# Altium footprint library LukaLIBRARY.PcbLib: 772 footprints (part 6 of 49)
Each footprint in its own frame and in the unit in brackets; x right, y up, seen from the top. Pads: shape width x height; smd on the part's side, far side on the other; paste and mask are expansions set on the pad; w line width, h text height; cw(c..) or ccw(c..) is an arc to the next point about the centre after c.
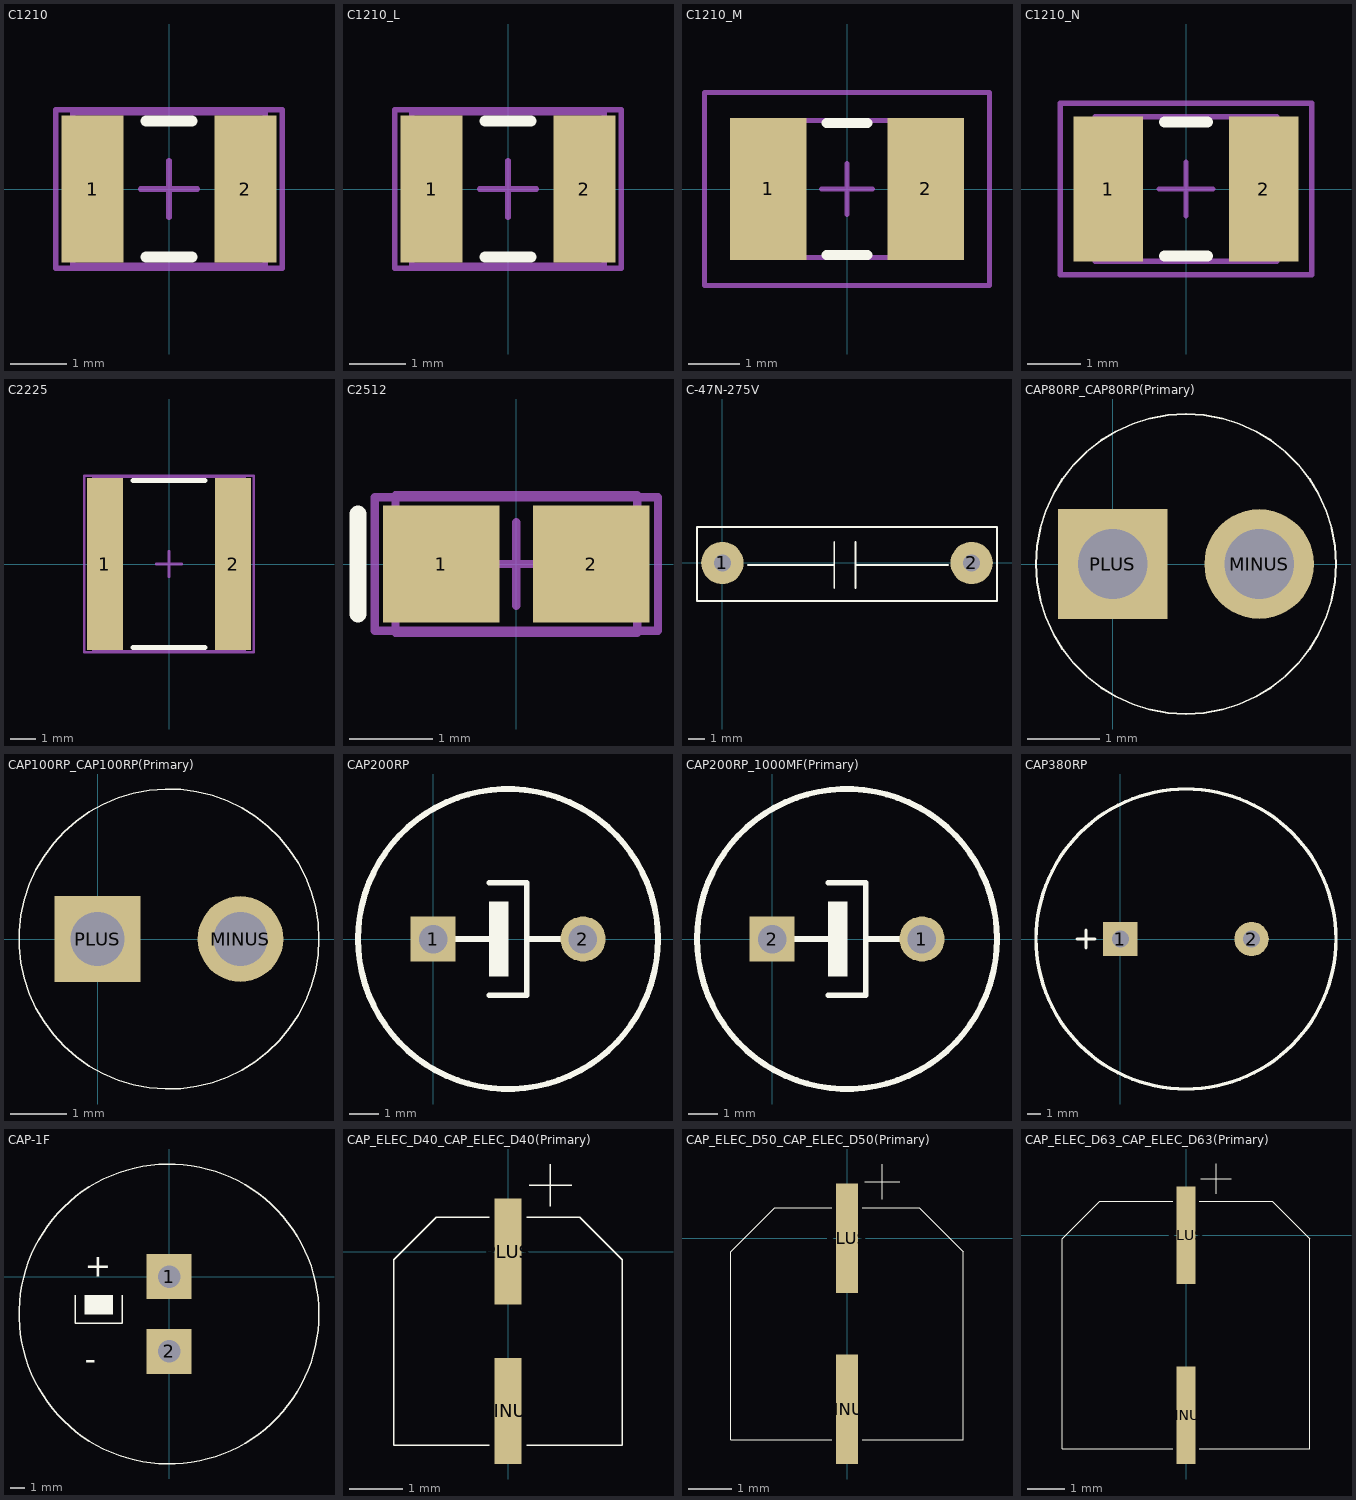
[diagram p5: the footprints below, top view; thin cyan lines are the x and y axes]

## C1210 [mm] "Chip Capacitor, Body 3.2x2.5mm, IPC High Density"
height 1.3
pads (2):
  rect 1.1x2.6 smd: 1(-1.35,0) 2(1.35,0)
Top Overlay:
  lines w0.2: -0.4,-1.2 0.4,-1.2 ; -0.4,1.2 0.4,1.2
Mechanical 13:
  lines w0.1: -1.7,-1.35 1.7,-1.35 1.7,1.35 -1.7,1.35 -1.7,-1.35
Mechanical 15:
  lines w0.1: -0.5,0 0.5,0 ; 0,-0.5 0,0.5 ; -2,-1.4 2,-1.4 2,1.4 -2,1.4 -2,-1.4
3D body: height 1.3, standoff 0, extent -1.7,-1.35 1.7,1.35

## C1210_L [mm] "Chip Capacitor, Body 3.2x2.5mm, IPC High Density"
height 1.5
pads (2):
  rect 1.1x2.6 smd: 1(-1.35,0) 2(1.35,0)
Top Overlay:
  lines w0.2: -0.4,-1.2 0.4,-1.2 ; -0.4,1.2 0.4,1.2
Mechanical 13:
  lines w0.1: -1.7,-1.35 1.7,-1.35 1.7,1.35 -1.7,1.35 -1.7,-1.35
Mechanical 15:
  lines w0.1: -0.5,0 0.5,0 ; 0,-0.5 0,0.5 ; -2,-1.4 2,-1.4 2,1.4 -2,1.4 -2,-1.4
3D body: height 1.5, standoff 0, extent -1.7,-1.35 1.7,1.35

## C1210_M [mm] "Chip Capacitor, Body 3.2x2.5mm, IPC Low Density"
height 1.5
pads (2):
  rect 1.5x2.8 smd: 1(-1.55,0) 2(1.55,0)
Top Overlay:
  lines w0.2: -0.4,-1.3 0.4,-1.3 ; -0.4,1.3 0.4,1.3
Mechanical 13:
  lines w0.1: -1.7,-1.35 1.7,-1.35 1.7,1.35 -1.7,1.35 -1.7,-1.35
Mechanical 15:
  lines w0.1: -0.5,0 0.5,0 ; 0,-0.5 0,0.5 ; -2.8,-1.9 2.8,-1.9 2.8,1.9 -2.8,1.9 -2.8,-1.9
3D body: height 1.5, standoff 0, extent -1.7,-1.35 1.7,1.35

## C1210_N [mm] "Chip Capacitor, Body 3.2x2.5mm, IPC Medium Density"
height 1.5
pads (2):
  rect 1.3x2.7 smd: 1(-1.45,0) 2(1.45,0)
Top Overlay:
  lines w0.2: -0.4,-1.25 0.4,-1.25 ; -0.4,1.25 0.4,1.25
Mechanical 13:
  lines w0.1: -1.7,-1.35 1.7,-1.35 1.7,1.35 -1.7,1.35 -1.7,-1.35
Mechanical 15:
  lines w0.1: -0.5,0 0.5,0 ; 0,-0.5 0,0.5 ; -2.35,-1.6 2.35,-1.6 2.35,1.6 -2.35,1.6 -2.35,-1.6
3D body: height 1.5, standoff 0, extent -1.7,-1.35 1.7,1.35

## C2225 [mm] "Chip Capacitor, Body 5.7x6.4mm, IPC High Density"
height 1.4
pads (2):
  rect 1.4x6.7 smd: 1(-2.5,0) 2(2.5,0)
Top Overlay:
  lines w0.2: -1.4,-3.25 1.4,-3.25 ; -1.4,3.25 1.4,3.25
Mechanical 13:
  lines w0.1: -2.95,-3.4 -2.95,3.4 2.95,3.4 2.95,-3.4 -2.95,-3.4
Mechanical 15:
  lines w0.1: -0.5,0 0.5,0 ; 0,-0.5 0,0.5 ; -3.3,-3.45 -3.3,3.45 3.3,3.45 3.3,-3.45 -3.3,-3.45
3D body: height 1.4, standoff 0, extent -2.95,-3.4 2.95,3.4

## C2512 [mm] "Chip Capacitor, Body 2.54x1.27mm, IPC High Density"
height 1.3
pads (2):
  rect 1.4x1.4 smd: 1(-0.9,0) 2(0.9,0)
Top Overlay:
  lines w0.2: -1.9,-0.6 -1.9,0.6
Mechanical 13:
  lines w0.1: -1.45,-0.825 1.45,-0.825 1.45,0.825 -1.45,0.825 -1.45,-0.825
Mechanical 15:
  lines w0.1: -0.5,0 0.5,0 ; 0,-0.5 0,0.5 ; -1.7,-0.8 1.7,-0.8 1.7,0.8 -1.7,0.8 -1.7,-0.8
3D body: height 1.3, standoff 0, extent -1.45,-0.825 1.45,0.825

## C-47N-275V [mil]
pads (2):
  round 100 hole 40 mask-1000: 1(0,0) 2(590,0)
Top Overlay:
  lines w3.94: 60,-5 265,-5 ; 265,-60 265,50 ; 315,-60 315,50 ; 315,-5 535,-5 ; -60,-90 650,-90 650,85 -60,85 -60,-90
Top Solder:
  region: 590,50.43 576.95,48.71 564.78,43.67 554.34,35.66 546.33,25.22 541.29,13.05 539.57,0 541.29,-13.05 546.33,-25.22 554.34,-35.66 564.78,-43.67 576.95,-48.71 590,-50.43 603.05,-48.71 615.22,-43.67 625.66,-35.66 633.67,-25.22 638.71,-13.05 640.43,0 638.71,13.05 633.67,25.22 625.66,35.66 615.22,43.67 603.05,48.71
  region: 0,50.43 -13.05,48.71 -25.22,43.67 -35.66,35.66 -43.67,25.22 -48.71,13.05 -50.43,0 -48.71,-13.05 -43.67,-25.22 -35.66,-35.66 -25.22,-43.67 -13.05,-48.71 0,-50.43 13.05,-48.71 25.22,-43.67 35.66,-35.66 43.67,-25.22 48.71,-13.05 50.43,0 48.71,13.05 43.67,25.22 35.66,35.66 25.22,43.67 13.05,48.71
Bottom Solder:
  region: 590,50.43 576.95,48.71 564.78,43.67 554.34,35.66 546.33,25.22 541.29,13.05 539.57,0 541.29,-13.05 546.33,-25.22 554.34,-35.66 564.78,-43.67 576.95,-48.71 590,-50.43 603.05,-48.71 615.22,-43.67 625.66,-35.66 633.67,-25.22 638.71,-13.05 640.43,0 638.71,13.05 633.67,25.22 625.66,35.66 615.22,43.67 603.05,48.71
  region: 0,50.43 -13.05,48.71 -25.22,43.67 -35.66,35.66 -43.67,25.22 -48.71,13.05 -50.43,0 -48.71,-13.05 -43.67,-25.22 -35.66,-35.66 -25.22,-43.67 -13.05,-48.71 0,-50.43 13.05,-48.71 25.22,-43.67 35.66,-35.66 43.67,-25.22 48.71,-13.05 50.43,0 48.71,13.05 43.67,25.22 35.66,35.66 25.22,43.67 13.05,48.71

## CAP80RP_CAP80RP(Primary) [mil]
pads (2):
  round 60 hole 38 mask-1000: MINUS(80,0)
  rect 60x60 hole 38 mask-1000: PLUS(0,0)
Top Overlay:
  circle w1: c40,0 r82
Top Solder:
  region: -30,-30 30,-30 30,30 -30,30
  region: 80,30.26 72.17,29.23 64.87,26.2 58.6,21.4 53.8,15.13 50.77,7.83 49.74,0 50.77,-7.83 53.8,-15.13 58.6,-21.4 64.87,-26.2 72.17,-29.23 80,-30.26 87.83,-29.23 95.13,-26.2 101.4,-21.4 106.2,-15.13 109.23,-7.83 110.26,0 109.23,7.83 106.2,15.13 101.4,21.4 95.13,26.2 87.83,29.23
Bottom Solder:
  region: -30,-30 30,-30 30,30 -30,30
  region: 80,30.26 72.17,29.23 64.87,26.2 58.6,21.4 53.8,15.13 50.77,7.83 49.74,0 50.77,-7.83 53.8,-15.13 58.6,-21.4 64.87,-26.2 72.17,-29.23 80,-30.26 87.83,-29.23 95.13,-26.2 101.4,-21.4 106.2,-15.13 109.23,-7.83 110.26,0 109.23,7.83 106.2,15.13 101.4,21.4 95.13,26.2 87.83,29.23

## CAP100RP_CAP100RP(Primary) [mil]
pads (2):
  round 60 hole 38 mask-1000: MINUS(100,0)
  rect 60x60 hole 38 mask-1000: PLUS(0,0)
Top Overlay:
  circle w1: c50,0 r105
Top Solder:
  region: -30,-30 30,-30 30,30 -30,30
  region: 100,30.26 92.17,29.23 84.87,26.2 78.6,21.4 73.8,15.13 70.77,7.83 69.74,0 70.77,-7.83 73.8,-15.13 78.6,-21.4 84.87,-26.2 92.17,-29.23 100,-30.26 107.83,-29.23 115.13,-26.2 121.4,-21.4 126.2,-15.13 129.23,-7.83 130.26,0 129.23,7.83 126.2,15.13 121.4,21.4 115.13,26.2 107.83,29.23
Bottom Solder:
  region: -30,-30 30,-30 30,30 -30,30
  region: 100,30.26 92.17,29.23 84.87,26.2 78.6,21.4 73.8,15.13 70.77,7.83 69.74,0 70.77,-7.83 73.8,-15.13 78.6,-21.4 84.87,-26.2 92.17,-29.23 100,-30.26 107.83,-29.23 115.13,-26.2 121.4,-21.4 126.2,-15.13 129.23,-7.83 130.26,0 129.23,7.83 126.2,15.13 121.4,21.4 115.13,26.2 107.83,29.23

## CAP200RP [mil]
pads (2):
  rect 60x60 hole 38 mask-1000: 1(0,0)
  round 60 hole 38 mask-1000: 2(200,0)
Top Overlay:
  circle w7.87: c100,0 r200
  region: 75,50 75,-50 100,-50 100,50
  lines w7.87: 25,0 75,0 ; 75,-75 125,-75 125,75 75,75 ; 125,0 175,0
Top Solder:
  region: 200,30.26 192.17,29.23 184.87,26.2 178.6,21.4 173.79,15.13 170.77,7.83 169.74,0 170.77,-7.83 173.79,-15.13 178.6,-21.4 184.87,-26.2 192.17,-29.23 200,-30.26 207.83,-29.23 215.13,-26.2 221.4,-21.4 226.21,-15.13 229.23,-7.83 230.26,0 229.23,7.83 226.21,15.13 221.4,21.4 215.13,26.2 207.83,29.23
  region: -30,-30 30,-30 30,30 -30,30
Bottom Solder:
  region: 200,30.26 192.17,29.23 184.87,26.2 178.6,21.4 173.79,15.13 170.77,7.83 169.74,0 170.77,-7.83 173.79,-15.13 178.6,-21.4 184.87,-26.2 192.17,-29.23 200,-30.26 207.83,-29.23 215.13,-26.2 221.4,-21.4 226.21,-15.13 229.23,-7.83 230.26,0 229.23,7.83 226.21,15.13 221.4,21.4 215.13,26.2 207.83,29.23
  region: -30,-30 30,-30 30,30 -30,30

## CAP200RP_1000MF(Primary) [mil]
pads (2):
  round 60 hole 38 mask-1000: 1(200,0)
  rect 60x60 hole 38 mask-1000: 2(0,0)
Top Overlay:
  circle w7.87: c100,0 r200
  region: 75,50 75,-50 100,-50 100,50
  lines w7.87: 25,0 75,0 ; 75,-75 125,-75 125,75 75,75 ; 125,0 175,0
Top Solder:
  region: -30,-30 30,-30 30,30 -30,30
  region: 200,30.26 192.17,29.23 184.87,26.2 178.6,21.4 173.79,15.13 170.77,7.83 169.74,0 170.77,-7.83 173.79,-15.13 178.6,-21.4 184.87,-26.2 192.17,-29.23 200,-30.26 207.83,-29.23 215.13,-26.2 221.4,-21.4 226.21,-15.13 229.23,-7.83 230.26,0 229.23,7.83 226.21,15.13 221.4,21.4 215.13,26.2 207.83,29.23
Bottom Solder:
  region: -30,-30 30,-30 30,30 -30,30
  region: 200,30.26 192.17,29.23 184.87,26.2 178.6,21.4 173.79,15.13 170.77,7.83 169.74,0 170.77,-7.83 173.79,-15.13 178.6,-21.4 184.87,-26.2 192.17,-29.23 200,-30.26 207.83,-29.23 215.13,-26.2 221.4,-21.4 226.21,-15.13 229.23,-7.83 230.26,0 229.23,7.83 226.21,15.13 221.4,21.4 215.13,26.2 207.83,29.23

## CAP380RP [mil]
pads (2):
  rect 100x100 hole 50 mask-1000: 1(0,0)
  round 100 hole 50 mask-1000: 2(380,0)
Top Overlay:
  circle w10: c190,0 r435
  lines w10: -125,0 -75,0 ; -100,-25 -100,25
Top Solder:
  region: -50,-50 50,-50 50,50 -50,50
  region: 380,50.43 366.95,48.71 354.78,43.67 344.34,35.66 336.33,25.22 331.29,13.05 329.57,0 331.29,-13.05 336.33,-25.22 344.34,-35.66 354.78,-43.67 366.95,-48.71 380,-50.43 393.05,-48.71 405.22,-43.67 415.66,-35.66 423.67,-25.22 428.71,-13.05 430.43,0 428.71,13.05 423.67,25.22 415.66,35.66 405.22,43.67 393.05,48.71
Bottom Solder:
  region: -50,-50 50,-50 50,50 -50,50
  region: 380,50.43 366.95,48.71 354.78,43.67 344.34,35.66 336.33,25.22 331.29,13.05 329.57,0 331.29,-13.05 336.33,-25.22 344.34,-35.66 354.78,-43.67 366.95,-48.71 380,-50.43 393.05,-48.71 405.22,-43.67 415.66,-35.66 423.67,-25.22 428.71,-13.05 430.43,0 428.71,13.05 423.67,25.22 415.66,35.66 405.22,43.67 393.05,48.71

## CAP-1F [mil]
pads (2):
  rect 120x120 hole 60 mask-1000: 1(0,0) 2(0,-200)
Top Overlay:
  circle w3.94: c0,-100 r400
  region: -225,-50 -225,-100 -150,-100 -150,-50
  lines w3.94: -250,-50 -250,-125 -125,-125 -125,-50
  text "-" at -225,-250 h62.5
  text "+" at -225,0 h62.5
Top Solder:
  region: -60,-260 60,-260 60,-140 -60,-140
  region: -60,-60 60,-60 60,60 -60,60
Bottom Solder:
  region: -60,-260 60,-260 60,-140 -60,-140
  region: -60,-60 60,-60 60,60 -60,60

## CAP_ELEC_D40_CAP_ELEC_D40(Primary) [mm]
pads (2):
  rect 0.5x2 smd: MINUS(0,-3) PLUS(0,0)
Top Overlay:
  lines w0.025: -0.35,-3.65 -2.15,-3.65 -2.15,-0.15 -1.35,0.65 -0.35,0.65 ; 0.35,-3.65 2.15,-3.65 2.15,-0.15 1.35,0.65 0.35,0.65 ; 0.4,1.25 1.2,1.25 ; 0.8,0.85 0.8,1.65

## CAP_ELEC_D50_CAP_ELEC_D50(Primary) [mm]
pads (2):
  rect 0.5x2.5 smd: MINUS(0,-3.9) PLUS(0,0)
Top Overlay:
  lines w0.025: -0.35,-4.6 -2.65,-4.6 -2.65,-0.3 -1.65,0.7 -0.35,0.7 ; 0.35,-4.6 2.65,-4.6 2.65,-0.3 1.65,0.7 0.35,0.7 ; 0.4,1.3 1.2,1.3 ; 0.8,0.9 0.8,1.7

## CAP_ELEC_D63_CAP_ELEC_D63(Primary) [mm]
pads (2):
  rect 0.5x2.6 smd: MINUS(0,-4.8) PLUS(0,0)
Top Overlay:
  lines w0.025: -0.35,-5.7 -3.3,-5.7 -3.3,-0.1 -2.3,0.9 -0.35,0.9 ; 0.35,-5.7 3.3,-5.7 3.3,-0.1 2.3,0.9 0.35,0.9 ; 0.4,1.5 1.2,1.5 ; 0.8,1.1 0.8,1.9